# Altium footprint library Reflow3D1411sep.PcbLib: 657 footprints (part 37 of 42)
Each footprint in its own frame and in the unit in brackets; x right, y up, seen from the top. Pads: shape width x height; smd on the part's side, far side on the other; paste and mask are expansions set on the pad; w line width, h text height; cw(c..) or ccw(c..) is an arc to the next point about the centre after c.
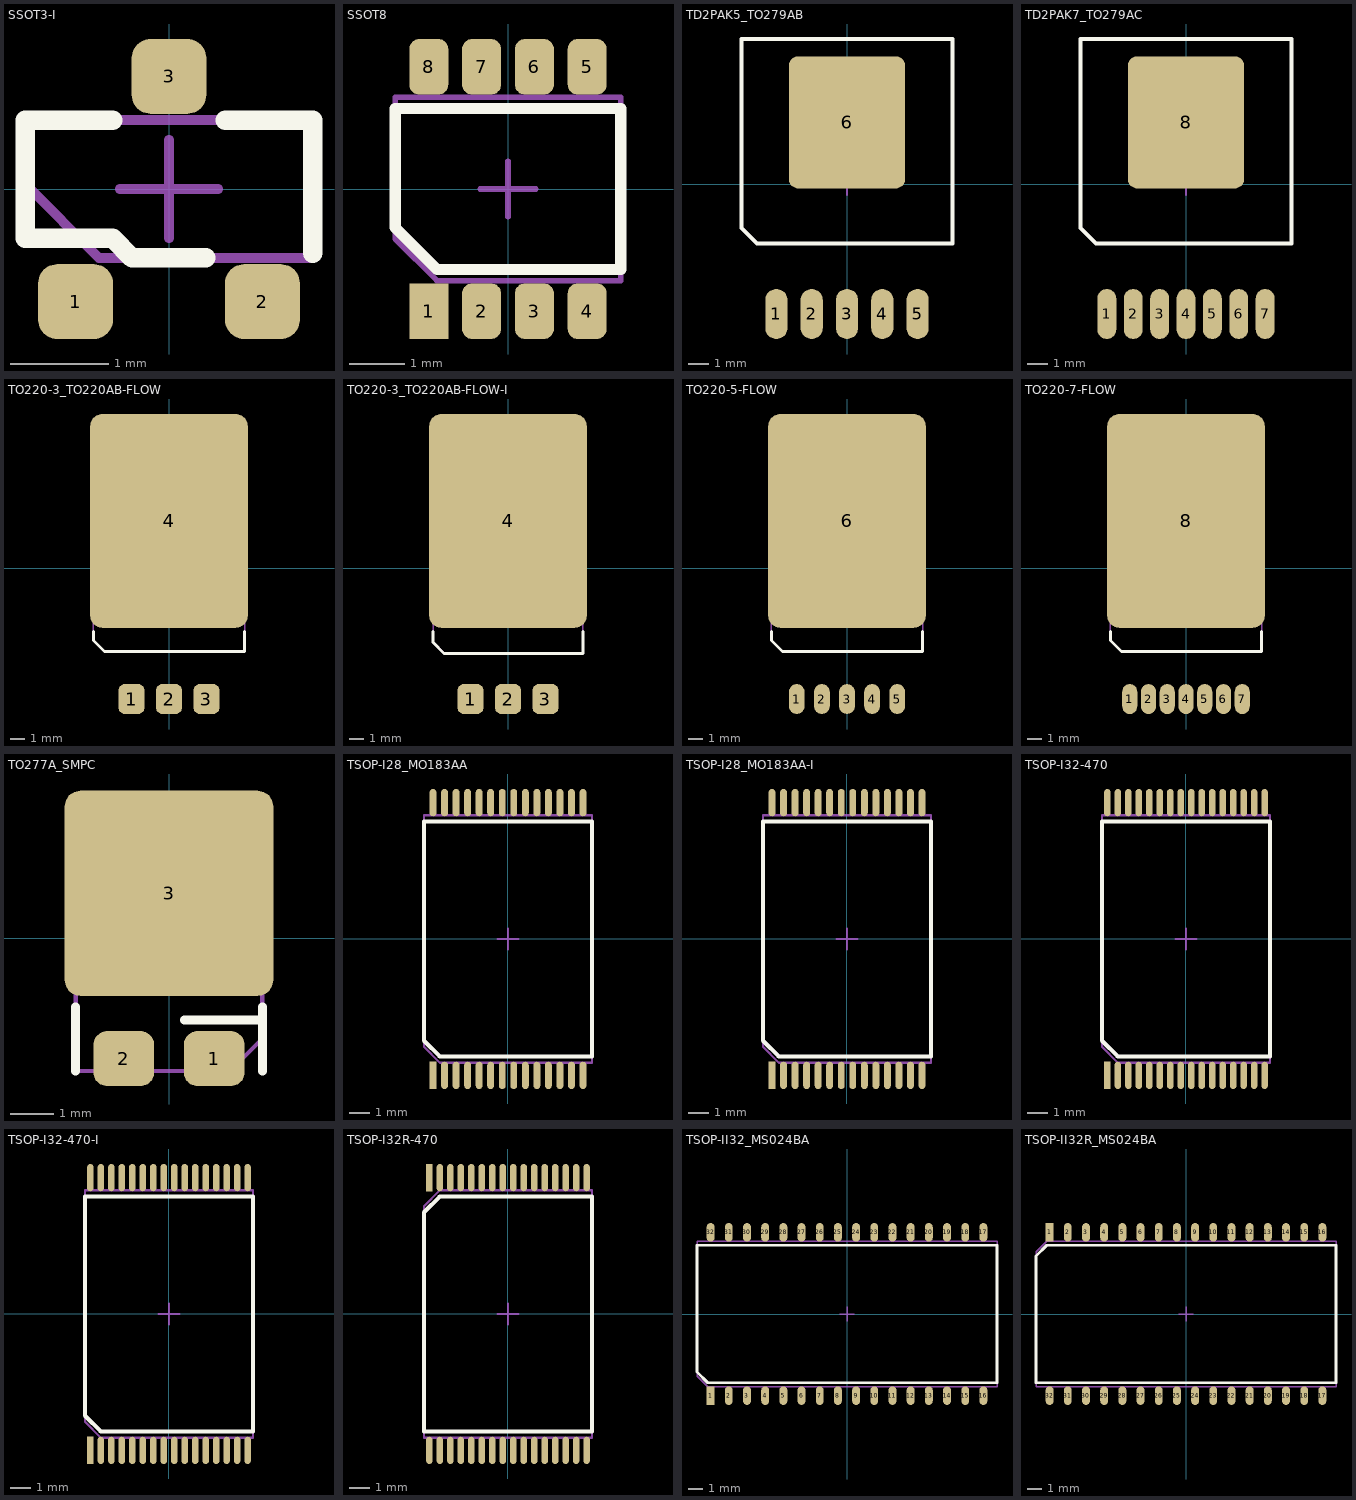
[diagram p36: the footprints below, top view; thin cyan lines are the x and y axes]

## SSOT3-I [mm] "www.national.com, ma03b.pdf"
height 1
pads (3):
  rrect50% 0.76x0.76 smd mask+0.075: 1(-0.95,-1.145) 2(0.95,-1.145) 3(0,1.145)
Top Overlay:
  lines w0.2: -0.575,0.7 -1.46,0.7 -1.46,-0.5 -0.575,-0.5 -0.375,-0.7 0.375,-0.7 ; 0.575,0.7 1.46,0.7 1.46,-0.65
Mechanical 13:
  lines w0.1: -1.46,0.05 -0.71,-0.7 1.46,-0.7 1.46,0.7 -1.46,0.7 -1.46,0.05
Mechanical 15:
  lines w0.1: -0.5,0 0.5,0 ; 0,-0.5 0,0.5
3D body: height 1.12, standoff 0, extent -1.52,-0.735 1.52,0.735

## SSOT8 [mm] "www.fairchildsemi.com, MA08C.pdf"
height 1.11
pads (8):
  rect 0.7x1 smd mask+0.05: 1(-1.425,-2.2)
  rrect50% 0.7x1 smd mask+0.05: 2(-0.475,-2.2) 3(0.475,-2.2) 4(1.425,-2.2) 5(1.425,2.2) 6(0.475,2.2) 7(-0.475,2.2) 8(-1.425,2.2)
Top Overlay:
  lines w0.2: -2.03,-0.695 -1.275,-1.45 2.03,-1.45 2.03,1.45 -2.03,1.45 -2.03,-0.695
Mechanical 13:
  lines w0.1: -2.03,-0.9 -1.28,-1.65 2.03,-1.65 2.03,1.65 -2.03,1.65 -2.03,-0.9
Mechanical 15:
  lines w0.1: -0.5,0 0.5,0 ; 0,-0.5 0,0.5
3D body: height 1.24, standoff 0, extent -2.09,-1.71 2.09,1.71

## TD2PAK5_TO279AB [mm] "www.national.com, tj5a.pdf, AN-1797.pdf"
height 2
pads (6):
  oval 1.07x2.41 smd mask+0.075: 1(-3.4,-6.235) 2(-1.7,-6.235) 3(0,-6.235) 4(1.7,-6.235) 5(3.4,-6.235)
  rrect15% 5.59x6.35 smd paste-25.4 mask+0.075: 6(0,2.99)
Top Overlay:
  lines w0.2: -5.08,-2.095 -5.08,7.005 5.08,7.005 5.08,-2.845 -4.33,-2.845 -5.08,-2.095
Top Paste:
  region: 0.15,2.84 0.15,-0.035 2.645,-0.035 2.645,2.84
  region: 0.15,6.015 0.15,3.14 2.645,3.14 2.645,6.015
  region: -2.645,6.015 -2.645,3.14 -0.15,3.14 -0.15,6.015
  region: -2.645,2.84 -2.645,-0.035 -0.15,-0.035 -0.15,2.84
Mechanical 13:
  lines w0.1: -5.08,-2.095 -4.33,-2.845 5.08,-2.845 5.08,7.005 -5.08,7.005 -5.08,-2.095
Mechanical 15:
  lines w0.1: -0.5,0 0.5,0 ; 0,-0.5 0,0.5
3D body: height 2.1, standoff 0, extent -5.205,-2.97 5.205,7.13

## TD2PAK7_TO279AC [mm] "www.national.com, tj7a.pdf, AN-1797.pdf"
height 2
pads (8):
  oval 0.91x2.41 smd mask+0.075: 1(-3.81,-6.235) 2(-2.54,-6.235) 3(-1.27,-6.235) 4(0,-6.235) 5(1.27,-6.235) 6(2.54,-6.235) 7(3.81,-6.235)
  rrect15% 5.59x6.35 smd paste-25.4 mask+0.075: 8(0,2.99)
Top Overlay:
  lines w0.2: -5.08,-2.095 -4.33,-2.845 5.08,-2.845 5.08,7.005 -5.08,7.005 -5.08,-2.095
Top Paste:
  region: -2.645,2.84 -2.645,-0.035 -0.15,-0.035 -0.15,2.84
  region: -2.645,6.015 -2.645,3.14 -0.15,3.14 -0.15,6.015
  region: 0.15,6.015 0.15,3.14 2.645,3.14 2.645,6.015
  region: 0.15,2.84 0.15,-0.035 2.645,-0.035 2.645,2.84
Mechanical 13:
  lines w0.1: -5.08,-2.095 -5.08,7.005 5.08,7.005 5.08,-2.845 -4.33,-2.845 -5.08,-2.095
Mechanical 15:
  lines w0.1: -0.5,0 0.5,0 ; 0,-0.5 0,0.5
3D body: height 2.1, standoff 0, extent -5.205,-2.97 5.205,7.13

## TO220-3_TO220AB-FLOW [mm] "www.linear.com, TO-220_3_05-08-1492.pdf; www.infineon.com, Processing_TO.pdf"
height 4.38
pads (4):
  rrect50% 1.78x2.03 smd mask+0.075: 1(-2.54,-8.87) 2(0,-8.87) 3(2.54,-8.87)
  rrect15% 10.67x14.48 smd paste-25.4 mask+0.075: 4(0,3.195)
Top Overlay:
  lines w0.2: -5.115,-4.3 -5.115,-4.905 -4.365,-5.655 5.115,-5.655 5.115,-4.3
Top Paste:
  region: 1.6,-0.455 -1.6,-0.455 -1.6,-3.655 1.6,-3.655
  region: -1.9,-0.455 -5.1,-0.455 -5.1,-3.655 -1.9,-3.655
  region: 5.1,-0.455 1.9,-0.455 1.9,-3.655 5.1,-3.655
  region: 5.1,3.045 1.9,3.045 1.9,-0.155 5.1,-0.155
  region: -1.9,3.045 -5.1,3.045 -5.1,-0.155 -1.9,-0.155
  region: 1.6,3.045 -1.6,3.045 -1.6,-0.155 1.6,-0.155
  region: 1.6,6.545 -1.6,6.545 -1.6,3.345 1.6,3.345
  region: -1.9,6.545 -5.1,6.545 -5.1,3.345 -1.9,3.345
  region: 5.1,6.545 1.9,6.545 1.9,3.345 5.1,3.345
  region: 1.6,10.045 -1.6,10.045 -1.6,6.845 1.6,6.845
  region: -1.9,10.045 -5.1,10.045 -5.1,6.845 -1.9,6.845
  region: 5.1,10.045 1.9,10.045 1.9,6.845 5.1,6.845
Mechanical 13:
  circle w0.1: c0,6.535 r1.92
  lines w0.1: -5.115,-4.905 -4.365,-5.655 5.115,-5.655 5.115,9.465 -5.115,9.465 -5.115,-4.905
Mechanical 15:
  lines w0.1: -0.5,0 0.5,0 ; 0,-0.5 0,0.5
3D body: height 4.57, standoff 0, extent -5.27,-5.97 5.27,9.78

## TO220-3_TO220AB-FLOW-I [mm] "www.linear.com, TO-220_3_05-08-1492.pdf; www.jedec.org, TO-220K.pdf; www.infineon.com, Processing_TO.pdf"
height 4.19
pads (4):
  rrect50% 1.78x2.03 smd mask+0.075: 1(-2.54,-8.87) 2(0,-8.87) 3(2.54,-8.87)
  rrect15% 10.67x14.48 smd paste-25.4 mask+0.075: 4(0,3.195)
Top Overlay:
  lines w0.2: -5.08,-4.3 -5.08,-5.03 -4.33,-5.78 5.08,-5.78 5.08,-4.3
Top Paste:
  region: 5.1,10.045 1.9,10.045 1.9,6.845 5.1,6.845
  region: -1.9,10.045 -5.1,10.045 -5.1,6.845 -1.9,6.845
  region: 1.6,10.045 -1.6,10.045 -1.6,6.845 1.6,6.845
  region: 5.1,6.545 1.9,6.545 1.9,3.345 5.1,3.345
  region: -1.9,6.545 -5.1,6.545 -5.1,3.345 -1.9,3.345
  region: 1.6,6.545 -1.6,6.545 -1.6,3.345 1.6,3.345
  region: 1.6,3.045 -1.6,3.045 -1.6,-0.155 1.6,-0.155
  region: -1.9,3.045 -5.1,3.045 -5.1,-0.155 -1.9,-0.155
  region: 5.1,3.045 1.9,3.045 1.9,-0.155 5.1,-0.155
  region: 5.1,-0.455 1.9,-0.455 1.9,-3.655 5.1,-3.655
  region: -1.9,-0.455 -5.1,-0.455 -5.1,-3.655 -1.9,-3.655
  region: 1.6,-0.455 -1.6,-0.455 -1.6,-3.655 1.6,-3.655
Mechanical 13:
  circle w0.1: c0,6.795 r1.92
  lines w0.1: -5.08,-5.03 -5.08,9.59 5.08,9.59 5.08,-5.78 -4.33,-5.78 -5.08,-5.03
Mechanical 15:
  lines w0.1: -0.5,0 0.5,0 ; 0,-0.5 0,0.5
3D body: height 4.83, standoff 0, extent -5.335,-6.35 5.335,10.16

## TO220-5-FLOW [mm] "www.linear.com, TO-220_5_05-08-1493.pdf; www.infineon.com, Processing_TO.pdf"
height 4.38
pads (6):
  oval 1.07x2.03 smd mask+0.075: 1(-3.4,-8.87) 2(-1.7,-8.87) 3(0,-8.87) 4(1.7,-8.87) 5(3.4,-8.87)
  rrect15% 10.67x14.48 smd paste-25.4 mask+0.075: 6(0,3.195)
Top Overlay:
  lines w0.2: -5.115,-4.3 -5.115,-4.905 -4.365,-5.655 5.115,-5.655 5.115,-4.3
Top Paste:
  region: 1.6,-0.455 -1.6,-0.455 -1.6,-3.655 1.6,-3.655
  region: -1.9,-0.455 -5.1,-0.455 -5.1,-3.655 -1.9,-3.655
  region: 5.1,-0.455 1.9,-0.455 1.9,-3.655 5.1,-3.655
  region: 5.1,3.045 1.9,3.045 1.9,-0.155 5.1,-0.155
  region: -1.9,3.045 -5.1,3.045 -5.1,-0.155 -1.9,-0.155
  region: 1.6,3.045 -1.6,3.045 -1.6,-0.155 1.6,-0.155
  region: 1.6,6.545 -1.6,6.545 -1.6,3.345 1.6,3.345
  region: -1.9,6.545 -5.1,6.545 -5.1,3.345 -1.9,3.345
  region: 5.1,6.545 1.9,6.545 1.9,3.345 5.1,3.345
  region: 1.6,10.045 -1.6,10.045 -1.6,6.845 1.6,6.845
  region: -1.9,10.045 -5.1,10.045 -5.1,6.845 -1.9,6.845
  region: 5.1,10.045 1.9,10.045 1.9,6.845 5.1,6.845
Mechanical 13:
  circle w0.1: c0,6.535 r1.92
  lines w0.1: -5.115,-4.905 -4.365,-5.655 5.115,-5.655 5.115,9.465 -5.115,9.465 -5.115,-4.905
Mechanical 15:
  lines w0.1: -0.5,0 0.5,0 ; 0,-0.5 0,0.5
3D body: height 4.57, standoff 0, extent -5.27,-5.97 5.27,9.78

## TO220-7-FLOW [mm] "www.linear.com, TO-220_7_05-08-1495.pdf; www.infineon.com, Processing_TO.pdf"
height 4.38
pads (8):
  oval 1.02x2.03 smd mask+0.05: 1(-3.81,-8.87) 2(-2.54,-8.87) 3(-1.27,-8.87) 4(0,-8.87) 5(1.27,-8.87) 6(2.54,-8.87) 7(3.81,-8.87)
  rrect15% 10.67x14.48 smd paste-25.4 mask+0.075: 8(0,3.195)
Top Overlay:
  lines w0.2: -5.115,-4.3 -5.115,-4.905 -4.365,-5.655 5.115,-5.655 5.115,-4.3
Top Paste:
  region: 1.6,-0.455 -1.6,-0.455 -1.6,-3.655 1.6,-3.655
  region: -1.9,-0.455 -5.1,-0.455 -5.1,-3.655 -1.9,-3.655
  region: 5.1,-0.455 1.9,-0.455 1.9,-3.655 5.1,-3.655
  region: 5.1,3.045 1.9,3.045 1.9,-0.155 5.1,-0.155
  region: -1.9,3.045 -5.1,3.045 -5.1,-0.155 -1.9,-0.155
  region: 1.6,3.045 -1.6,3.045 -1.6,-0.155 1.6,-0.155
  region: 1.6,6.545 -1.6,6.545 -1.6,3.345 1.6,3.345
  region: -1.9,6.545 -5.1,6.545 -5.1,3.345 -1.9,3.345
  region: 5.1,6.545 1.9,6.545 1.9,3.345 5.1,3.345
  region: 1.6,10.045 -1.6,10.045 -1.6,6.845 1.6,6.845
  region: -1.9,10.045 -5.1,10.045 -5.1,6.845 -1.9,6.845
  region: 5.1,10.045 1.9,10.045 1.9,6.845 5.1,6.845
Mechanical 13:
  circle w0.1: c0,6.535 r1.92
  lines w0.1: -5.115,-4.905 -4.365,-5.655 5.115,-5.655 5.115,9.465 -5.115,9.465 -5.115,-4.905
Mechanical 15:
  lines w0.1: -0.5,0 0.5,0 ; 0,-0.5 0,0.5
3D body: height 4.57, standoff 0, extent -5.27,-5.97 5.27,9.78

## TO277A_SMPC [mm] "www.vishay.com, s4pm.pdf; www.jedec.org, TO-277A.pdf"
height 1.1
pads (3):
  rrect50% 1.4x1.27 smd mask+0.075: 1(1.04,-2.765) 2(-1.04,-2.765)
  rrect15% 4.8x4.72 smd mask+0.075: 3(0,1.04)
Top Overlay:
  lines w0.2: -2.15,-3.05 -2.15,-1.575 ; 0.35,-1.875 2.15,-1.875 ; 2.15,-3.05 2.15,-1.575
Mechanical 13:
  lines w0.1: -2.15,2.3 2.15,2.3 ; -2.15,-3.05 -2.15,3.05 2.15,3.05 2.15,-2.3 1.4,-3.05 -2.15,-3.05
Mechanical 15:
  lines w0.1: -0.5,0 0.5,0 ; 0,-0.5 0,0.5
3D body: height 1.2, standoff 0, extent -2.175,-3.075 2.175,3.075

## TSOP-I28_MO183AA [mm] "www.idt.com, PSC4044.pdf; www.jedec.org, Mo-183a.pdf"
height 1.08
pads (28):
  rect 0.33x1.3 smd mask+0.05: 1(-3.575,-6.5)
  oval 0.33x1.3 smd mask+0.05: 2(-3.025,-6.5) 3(-2.475,-6.5) 4(-1.925,-6.5) 5(-1.375,-6.5) 6(-0.825,-6.5) 7(-0.275,-6.5) 8(0.275,-6.5) 9(0.825,-6.5) 10(1.375,-6.5) 11(1.925,-6.5) 12(2.475,-6.5) 13(3.025,-6.5) 14(3.575,-6.5) 15(3.575,6.5) 16(3.025,6.5) 17(2.475,6.5) 18(1.925,6.5) 19(1.375,6.5) 20(0.825,6.5) 21(0.275,6.5) 22(-0.275,6.5) 23(-0.825,6.5) 24(-1.375,6.5) 25(-1.925,6.5) 26(-2.475,6.5) 27(-3.025,6.5) 28(-3.575,6.5)
Top Overlay:
  lines w0.2: -4,-4.85 -4,5.6 4,5.6 4,-5.6 -3.25,-5.6 -4,-4.85
Mechanical 13:
  lines w0.1: -4,-5.15 -4,5.9 4,5.9 4,-5.9 -3.25,-5.9 -4,-5.15
Mechanical 15:
  lines w0.1: -0.5,0 0.5,0 ; 0,-0.5 0,0.5
3D body: height 1.2, standoff 0, extent -4.05,-5.95 4.05,5.95

## TSOP-I28_MO183AA-I [mm] "www.cypress.com, 51-85071_0H_V.pdf; www.idt.com, PSC4044.pdf"
height 1.1
pads (28):
  rect 0.33x1.3 smd mask+0.05: 1(-3.575,-6.5)
  oval 0.33x1.3 smd mask+0.05: 2(-3.025,-6.5) 3(-2.475,-6.5) 4(-1.925,-6.5) 5(-1.375,-6.5) 6(-0.825,-6.5) 7(-0.275,-6.5) 8(0.275,-6.5) 9(0.825,-6.5) 10(1.375,-6.5) 11(1.925,-6.5) 12(2.475,-6.5) 13(3.025,-6.5) 14(3.575,-6.5) 15(3.575,6.5) 16(3.025,6.5) 17(2.475,6.5) 18(1.925,6.5) 19(1.375,6.5) 20(0.825,6.5) 21(0.275,6.5) 22(-0.275,6.5) 23(-0.825,6.5) 24(-1.375,6.5) 25(-1.925,6.5) 26(-2.475,6.5) 27(-3.025,6.5) 28(-3.575,6.5)
Top Overlay:
  lines w0.2: -4,-4.85 -4,5.6 4,5.6 4,-5.6 -3.25,-5.6 -4,-4.85
Mechanical 13:
  lines w0.1: -4,-5.15 -4,5.9 4,5.9 4,-5.9 -3.25,-5.9 -4,-5.15
Mechanical 15:
  lines w0.1: -0.5,0 0.5,0 ; 0,-0.5 0,0.5
3D body: height 1.2, standoff 0, extent -4.05,-5.95 4.05,5.95

## TSOP-I32-470 [mm] "www.idt.com, PSC4044.pdf"
height 1.08
pads (32):
  rect 0.3x1.3 smd mask+0.05: 1(-3.75,-6.5)
  oval 0.3x1.3 smd mask+0.05: 2(-3.25,-6.5) 3(-2.75,-6.5) 4(-2.25,-6.5) 5(-1.75,-6.5) 6(-1.25,-6.5) 7(-0.75,-6.5) 8(-0.25,-6.5) 9(0.25,-6.5) 10(0.75,-6.5) 11(1.25,-6.5) 12(1.75,-6.5) 13(2.25,-6.5) 14(2.75,-6.5) 15(3.25,-6.5) 16(3.75,-6.5) 17(3.75,6.5) 18(3.25,6.5) 19(2.75,6.5) 20(2.25,6.5) 21(1.75,6.5) 22(1.25,6.5) 23(0.75,6.5) 24(0.25,6.5) 25(-0.25,6.5) 26(-0.75,6.5) 27(-1.25,6.5) 28(-1.75,6.5) 29(-2.25,6.5) 30(-2.75,6.5) 31(-3.25,6.5) 32(-3.75,6.5)
Top Overlay:
  lines w0.2: -4,-4.85 -3.25,-5.6 4,-5.6 4,5.6 -4,5.6 -4,-4.85
Mechanical 13:
  lines w0.1: -4,-5.15 -3.25,-5.9 4,-5.9 4,5.9 -4,5.9 -4,-5.15
Mechanical 15:
  lines w0.1: -0.5,0 0.5,0 ; 0,-0.5 0,0.5
3D body: height 1.2, standoff 0, extent -4.05,-5.95 4.05,5.95

## TSOP-I32-470-I [mm] "www.cypress.com, 51-85094_0E_V.pdf; www.idt.com, PSC4044.pdf"
height 1.1
pads (32):
  rect 0.3x1.3 smd mask+0.05: 1(-3.75,-6.5)
  oval 0.3x1.3 smd mask+0.05: 2(-3.25,-6.5) 3(-2.75,-6.5) 4(-2.25,-6.5) 5(-1.75,-6.5) 6(-1.25,-6.5) 7(-0.75,-6.5) 8(-0.25,-6.5) 9(0.25,-6.5) 10(0.75,-6.5) 11(1.25,-6.5) 12(1.75,-6.5) 13(2.25,-6.5) 14(2.75,-6.5) 15(3.25,-6.5) 16(3.75,-6.5) 17(3.75,6.5) 18(3.25,6.5) 19(2.75,6.5) 20(2.25,6.5) 21(1.75,6.5) 22(1.25,6.5) 23(0.75,6.5) 24(0.25,6.5) 25(-0.25,6.5) 26(-0.75,6.5) 27(-1.25,6.5) 28(-1.75,6.5) 29(-2.25,6.5) 30(-2.75,6.5) 31(-3.25,6.5) 32(-3.75,6.5)
Top Overlay:
  lines w0.2: -4,-4.85 -4,5.6 4,5.6 4,-5.6 -3.25,-5.6 -4,-4.85
Mechanical 13:
  lines w0.1: -4,-5.15 -4,5.9 4,5.9 4,-5.9 -3.25,-5.9 -4,-5.15
Mechanical 15:
  lines w0.1: -0.5,0 0.5,0 ; 0,-0.5 0,0.5
3D body: height 1.2, standoff 0, extent -4.05,-5.95 4.05,5.95

## TSOP-I32R-470 [mm] "www.cypress.com, 001-04335.pdf; www.idt.com, PSC4044.pdf"
height 1.1
pads (32):
  rect 0.3x1.3 smd mask+0.05: 1(-3.75,6.5)
  oval 0.3x1.3 smd mask+0.05: 2(-3.25,6.5) 3(-2.75,6.5) 4(-2.25,6.5) 5(-1.75,6.5) 6(-1.25,6.5) 7(-0.75,6.5) 8(-0.25,6.5) 9(0.25,6.5) 10(0.75,6.5) 11(1.25,6.5) 12(1.75,6.5) 13(2.25,6.5) 14(2.75,6.5) 15(3.25,6.5) 16(3.75,6.5) 17(3.75,-6.5) 18(3.25,-6.5) 19(2.75,-6.5) 20(2.25,-6.5) 21(1.75,-6.5) 22(1.25,-6.5) 23(0.75,-6.5) 24(0.25,-6.5) 25(-0.25,-6.5) 26(-0.75,-6.5) 27(-1.25,-6.5) 28(-1.75,-6.5) 29(-2.25,-6.5) 30(-2.75,-6.5) 31(-3.25,-6.5) 32(-3.75,-6.5)
Top Overlay:
  lines w0.2: -4,-5.6 -4,4.85 -3.25,5.6 4,5.6 4,-5.6 -4,-5.6
Mechanical 13:
  lines w0.1: -4,-5.9 -4,5.15 -3.25,5.9 4,5.9 4,-5.9 -4,-5.9
Mechanical 15:
  lines w0.1: -0.5,0 0.5,0 ; 0,-0.5 0,0.5
3D body: height 1.2, standoff 0, extent -4.05,-5.95 4.05,5.95

## TSOP-II32_MS024BA [mm] "www.idt.com, PSC4050.pdf; www.jedec.org, MS-024H.pdf"
height 1.1
pads (32):
  rect 0.55x1.3 smd mask+0.075: 1(-9.525,-5.7)
  oval 0.55x1.3 smd mask+0.075: 2(-8.255,-5.7) 3(-6.985,-5.7) 4(-5.715,-5.7) 5(-4.445,-5.7) 6(-3.175,-5.7) 7(-1.905,-5.7) 8(-0.635,-5.7) 9(0.635,-5.7) 10(1.905,-5.7) 11(3.175,-5.7) 12(4.445,-5.7) 13(5.715,-5.7) 14(6.985,-5.7) 15(8.255,-5.7) 16(9.525,-5.7) 17(9.525,5.7) 18(8.255,5.7) 19(6.985,5.7) 20(5.715,5.7) 21(4.445,5.7) 22(3.175,5.7) 23(1.905,5.7) 24(0.635,5.7) 25(-0.635,5.7) 26(-1.905,5.7) 27(-3.175,5.7) 28(-4.445,5.7) 29(-5.715,5.7) 30(-6.985,5.7) 31(-8.255,5.7) 32(-9.525,5.7)
Top Overlay:
  lines w0.2: -10.475,-4.05 -10.475,4.8 10.475,4.8 10.475,-4.8 -9.725,-4.8 -10.475,-4.05
Mechanical 13:
  lines w0.1: -10.475,-4.33 -9.725,-5.08 10.475,-5.08 10.475,5.08 -10.475,5.08 -10.475,-4.33
Mechanical 15:
  lines w0.1: -0.5,0 0.5,0 ; 0,-0.5 0,0.5
3D body: height 1.2, standoff 0, extent -10.54,-5.145 10.54,5.145

## TSOP-II32R_MS024BA [mm] "www.cypress.com, 51-85138_0A_V.pdf; www.idt.com, PSC4050.pdf; www.jedec.org, MS-024H.pdf"
height 1.1
pads (32):
  rect 0.55x1.3 smd mask+0.075: 1(-9.525,5.7)
  oval 0.55x1.3 smd mask+0.075: 2(-8.255,5.7) 3(-6.985,5.7) 4(-5.715,5.7) 5(-4.445,5.7) 6(-3.175,5.7) 7(-1.905,5.7) 8(-0.635,5.7) 9(0.635,5.7) 10(1.905,5.7) 11(3.175,5.7) 12(4.445,5.7) 13(5.715,5.7) 14(6.985,5.7) 15(8.255,5.7) 16(9.525,5.7) 17(9.525,-5.7) 18(8.255,-5.7) 19(6.985,-5.7) 20(5.715,-5.7) 21(4.445,-5.7) 22(3.175,-5.7) 23(1.905,-5.7) 24(0.635,-5.7) 25(-0.635,-5.7) 26(-1.905,-5.7) 27(-3.175,-5.7) 28(-4.445,-5.7) 29(-5.715,-5.7) 30(-6.985,-5.7) 31(-8.255,-5.7) 32(-9.525,-5.7)
Top Overlay:
  lines w0.2: -10.475,-4.8 -10.475,4.05 -9.725,4.8 10.475,4.8 10.475,-4.8 -10.475,-4.8
Mechanical 13:
  lines w0.1: -10.475,-5.08 -10.475,4.33 -9.725,5.08 10.475,5.08 10.475,-5.08 -10.475,-5.08
Mechanical 15:
  lines w0.1: -0.5,0 0.5,0 ; 0,-0.5 0,0.5
3D body: height 1.2, standoff 0, extent -10.54,-5.145 10.54,5.145